# Altium integrated library AnalogDevices.IntLib: 130 symbols (part 3 of 4) (continued)
## ADM1266ACPZ (continued)
text: SENS; ADM; 1266

## ADM2682E
designator D?  (value not drawn)
RS-485 Isolated transceiver; Manufacturer: Analog Devices; ManufacturerPartNumber: ADM2682EBRIZ; Type: Микросхема; BCPId: *; Name: *; Package: RI-16-1
footprint SOIC127P1030X265-16N - 12.75lenght (SOIC, 16-Leads, Body 12,75x7,50mm, Pitch 1,27mm, IPC Medium Density)
pins: 1 GND1 (power) "Ground", 2 VCC (power) "External Capacitor Connection for the Regulated VCC Supply", 3 RxD (out) "External Capacitor Connection for the Regulated VCC Supply", 4 ~{RE} (in) "External Capacitor Connection for the Regulated VCC Supply", 5 DE (in) "External Capacitor Connection for the Regulated VCC Supply", 6 TxD (in) "External Capacitor Connection for the Regulated VCC Supply", 7 VCC (power) "External Capacitor Connection for the Regulated VCC Supply", 8 GND1 (power) "Ground", 9 GND2 (power) "Power ground", 10 Visoout (power) "Power ground", 11 Y (out) "Power ground", 12 Z (out) "Power ground", 13 B (in) "Power ground", 14 A (in) "Power ground", 15 Visoin (power) "Power ground", 16 GND2 (power) "Power ground"
text: A/B; 2682

## ADM4850
designator D?  (value not drawn)
5 V Selw-Rate Limited Half-Duplex RS-485/RS-422 Transceivers; ManufacturerPartNumber: ADM4850AR; Manufacturer: Analog Devices; Type: Микросхема; BCPId: *; TU/GOST: *; Package: SOIC-8
footprint SOIC127P600-8M (SOIC, 8-Leads, Body 4.9x3.9mm, Pitch 1.27mm, IPC Low Density)
pins: 1 RO (out) "Receiver Output", 2 ~{RE} (out) "Receiver Output Enable", 3 DE (out) "Driver Output Enable", 4 DI (in) "Driver Input", 5 GND (power), 6 A (io) "Noninverting Receiver Input A/Driver Output A", 7 B (io) "Inverting Receiver Input B/Driver Output B", 8 VCC (power) "5 V Power Supply"
text: A/B

## ADM7150ACPZ-3.3-R7
designator D?  (value not drawn)
800 mA, High PSRR, RF Linear Regulator 4.5 V to 16 V input voltage; Manufacturer: Analog Devices; Type: Микросхема; SymAuthor: Ерешко П.А.; Package: CP-8-11; ManufacturerPartNumber: ADM7150ACPZ-3.3-R7
footprint CP-8-11 (8-Lead Lead Frame Chip Scale Package [LFCSP_WD]   3 mmx3 mm Body, Very Very Thin, Dual Lead)
pins: 1 VREG "Regulated Input Supply Voltage to LDO Amplifier", 2 VOUT (power) "Regulated Output Voltage", 3 BYP "Low Noise Bypass Capacitor", 4 GND (power) "Ground", 5 RSNS "Reference Sense", 6 REF "Low Noise Reference Voltage Output", 7 EN (in) "Enable", 8 VIN (power) "Regulator Input Supply Voltage", EPAD EP (power) hidden to GND "Ground"
text: *STU; 7150

## ADM7150ACPZ-5.0-R7
designator D?  (value not drawn)
800 mA, High PSRR, RF Linear Regulator 4.5 V to 16 V input voltage; Manufacturer: Analog Devices; Type: Микросхема; SymAuthor: Ерешко П.А.; Package: CP-8-11; ManufacturerPartNumber: ADM7150ACPZ-5.0-R7
footprint CP-8-11 (8-Lead Lead Frame Chip Scale Package [LFCSP_WD]   3 mmx3 mm Body, Very Very Thin, Dual Lead)
pins: 1 VREG "Regulated Input Supply Voltage to LDO Amplifier", 2 VOUT (power) "Regulated Output Voltage", 3 BYP "Low Noise Bypass Capacitor", 4 GND (power) "Ground", 5 RSNS "Reference Sense", 6 REF "Low Noise Reference Voltage Output", 7 EN (in) "Enable", 8 VIN (power) "Regulator Input Supply Voltage", EPAD EP (power) hidden to GND "Ground"
text: *STU; 7150

## ADM7154ACPZ-1.8-R7
designator D?  (value not drawn)
600 mA, High PSRR, RF Linear Regulator; Manufacturer: Analog Devices; Type: Микросхема; SymAuthor: Ерешко П.А.; Package: CP-8-21; ManufacturerPartNumber: ADM7154ACPZ-1.8-R7
footprint QFN50P300X300X80_HS-9N (QFN, 8-Leads, Body 3,00x3,00mm, Pitch 0,50mm, Thermal Pad 2,54x1,70mm, IPC Medium Density)
pins: 1 VREG "Regulated Input Supply Voltage to LDO Amplifier", 2 VOUT (power) "Regulated Output Voltage", 3 BYP "Low Noise Bypass Capacitor", 4 GND (power) "Ground", 5 RSNS "Reference Sense", 6 REF "Low Noise Reference Voltage Output", 7 EN (in) "Enable", 8 VIN (power) "Regulator Input Supply Voltage", EPAD EP (power) hidden to GND "Ground"
text: *STU; 7154

## ADM7154ACPZ-3.3-R7
designator D?  (value not drawn)
600 mA, High PSRR, RF Linear Regulator; Manufacturer: Analog Devices; Type: Микросхема; SymAuthor: Ерешко П.А.; Package: CP-8-21; ManufacturerPartNumber: ADM7154ACPZ-3.3-R7
footprint QFN50P300X300X80_HS-9N (QFN, 8-Leads, Body 3,00x3,00mm, Pitch 0,50mm, Thermal Pad 2,54x1,70mm, IPC Medium Density)
pins: 1 VREG "Regulated Input Supply Voltage to LDO Amplifier", 2 VOUT (power) "Regulated Output Voltage", 3 BYP "Low Noise Bypass Capacitor", 4 GND (power) "Ground", 5 RSNS "Reference Sense", 6 REF "Low Noise Reference Voltage Output", 7 EN (in) "Enable", 8 VIN (power) "Regulator Input Supply Voltage", EPAD EP (power) hidden to GND "Ground"
text: *STU; 7154

## ADM7170ACPZ-3.3-R7
designator D?  (value not drawn)
6.5 V, 500 mA, Ultralow Noise, High PSRR, Fast Transient Response CMOS LDO; Manufacturer: Analog Devices; Type: Микросхема; Package: CP-8-21; ManufacturerPartNumber: ADM7170ACPZ-3.3-R7
footprint QFN50P300X300X80_HS-9N (QFN, 8-Leads, Body 3,00x3,00mm, Pitch 0,50mm, Thermal Pad 2,54x1,70mm, IPC Medium Density)
pins: 1 VOUT (power) "Regulated Output Voltage", 2 VOUT (power) "Regulated Output Voltage", 3 SENS "Sense Input. Connect this pin as close as possible to the load for best load regulation.", 4 SS "Soft Start", 5 EN (in) "Regulator Enable. Drive EN high to turn on the regulator", 6 GND (power) "Ground", 7 VIN (power) "Ground", 8 VIN (power) "Ground", EPAD EP (power) hidden to GND "Ground"
text: *STU; 7170

## ADM7170ACPZ-5.0-R7
designator D?  (value not drawn)
6.5 V, 500 mA, Ultralow Noise, High PSRR, Fast Transient Response CMOS LDO; Manufacturer: Analog Devices; Type: Микросхема; Package: CP-8-21; ManufacturerPartNumber: ADM7170ACPZ-5.0-R7
footprint QFN50P300X300X80_HS-9N (QFN, 8-Leads, Body 3,00x3,00mm, Pitch 0,50mm, Thermal Pad 2,54x1,70mm, IPC Medium Density)
pins: 1 VOUT (power) "Regulated Output Voltage", 2 VOUT (power) "Regulated Output Voltage", 3 SENS "Sense Input. Connect this pin as close as possible to the load for best load regulation.", 4 SS "Soft Start", 5 EN (in) "Regulator Enable. Drive EN high to turn on the regulator", 6 GND (power) "Ground", 7 VIN (power) "Ground", 8 VIN (power) "Ground", EPAD EP (power) hidden to GND "Ground"
text: *STU; 7170

## ADM7171ACPZ
designator D?, comment ADM7171ACPZ-X.X.-R7  (value not drawn)
6.5 V, 1 A, Ultralow Noise, High PSRR,  Fast Transient Response CMOS LDO; Manufacturer: Analog Devices; Type: Микросхема; BCPId: *; Name: *; Package: CP-8-21; ManufacturerPartNumber: ADM7171ACPZ-X.X.-R7
footprint QFN50P300X300X80_HS-9N (QFN, 8-Leads, Body 3,00x3,00mm, Pitch 0,50mm, Thermal Pad 2,54x1,70mm, IPC Medium Density)
pins: 1 VOUT (power) "Regulated Output Voltage", 2 VOUT (power) "Regulated Output Voltage", 3 SENS (power) "Sense Input", 4 SS "Soft Start", 5 EN (power) "Enable Input", 6 GND (power), 7 VIN (power) "Regulator Input Supply", 8 VIN (power) "Regulator Input Supply", EPAD (power) hidden to GND "The exposed GND pad"
text: *STU; ADM; 7171

## ADM8660ARZ
designator D?  (value not drawn)
CMOS Switched-Capacitor  Voltage Converters; Manufacturer: Analog Devices; Type: Микросхема; SymAuthor: Блохин В.А.; BCPId: *; Name: *; Package: R-8; ManufacturerPartNumber: ADM8660ARZ
footprint SOIC127P600-8M (SOIC, 8-Leads, Body 4.9x3.9mm, Pitch 1.27mm, IPC Low Density)
pins: 1 FC (power) "Frequency Control Input", 2 CAP+ (power) "Positive Charge-Pump Capacitor Termina", 3 GND (power), 4 CAP- (power) "Negative Charge-Pump Capacitor Terminal", 5 OUT (power) "Output, Negative Voltage", 6 LV (power) "Low Voltage Operation Input", 7 SD (power) "Shutdown", 8 V+ (power) "Positive Power Supply Input"
text: *STU; ADM; 8660

## ADP150AUJZ
designator D?  (value not drawn)
150 mA CMOS Linear Regulator; Manufacturer: Analog Devices; Type: Микросхема; SymAuthor: Календарова В.; BCPId: *; Package: UJ-5; Tolerance: *; ManufacturerPartNumber: ADP150AUJZ
footprint SOT95P280X100-5N (SOT23, 5-Leads, Body 2,90x2,80mm, Pitch 0,95mm, IPC Medium Density)
pins: 1 Vin (in), 2 GND (power), 3 EN (in), 4 NC hidden, 5 Vout (power)
text: STU

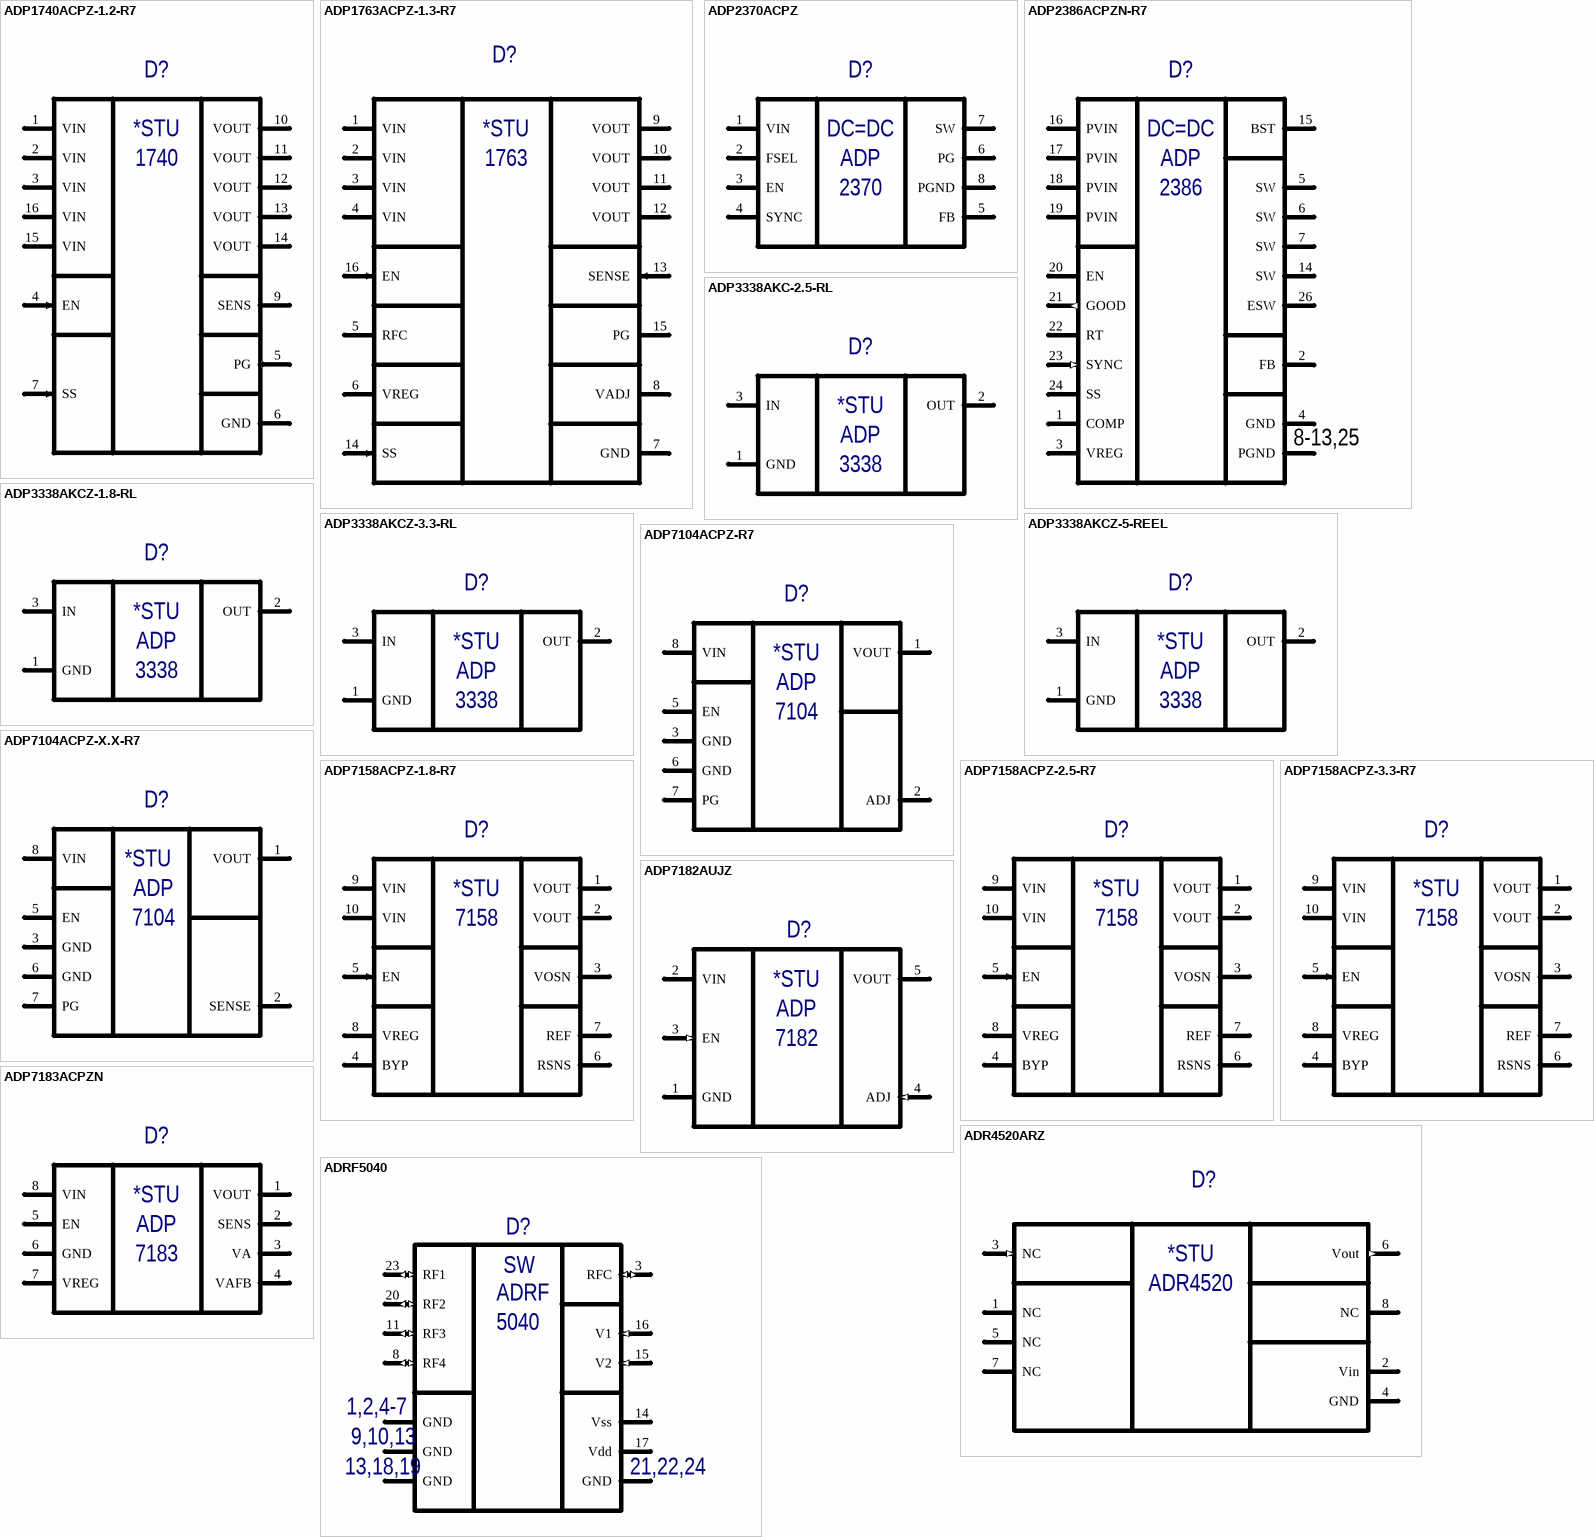
[diagram p14: symbols ADP1740ACPZ-1.2-R7 to ADRF5040]

## ADP1740ACPZ-1.2-R7
designator D?  (value not drawn)
6.5 V, 500 mA, Ultralow Noise, High PSRR, RF Linear Regulator; Manufacturer: Analog Devices; Type: Микросхема; Package: CP-16-23; ManufacturerPartNumber: ADP1740ACPZ-1.2-R7
footprint QFN65P400X400X80_HS-17N (QFN, 16-Leads, Body 4,00x4,00mm, Pitch 0,65mm, Thermal Pad 2,10x2,10mm, IPC Medium Density)
pins: 1 VIN (power) "Regulator Input Supply Voltage", 2 VIN (power) "Regulator Input Supply Voltage", 3 VIN (power) "Regulator Input Supply Voltage", 4 EN (in) "Enable", 5 PG (out) "Power-Good", 6 GND (power) "Ground", 7 SS (in) "Soft Start", 8 NC hidden "Not Connected.", 9 SENS "Sense Input", 10 VOUT (power) "Regulated Output Voltage", 11 VOUT (power) "Regulated Output Voltage", 12 VOUT (power) "Regulated Output Voltage", 13 VOUT (power) "Regulated Output Voltage", 14 VOUT (power) "Regulated Output Voltage", 15 VIN (power) "Regulator Input Supply Voltage", 16 VIN (power) "Regulator Input Supply Voltage", EPAD EP (power) hidden to GND "Ground"
text: *STU; 1740

## ADP1763ACPZ-1.3-R7
designator D?  (value not drawn)
3 A, Low VIN, Low Noise, CMOS Linear Regulator; Manufacturer: Analog Devices; Type: Микросхема; SymAuthor: Ерешко П.А.; Package: CP-16-22; ManufacturerPartNumber: ADP1763ACPZ-1.3-R7
footprint QFN50P300X300X80_HS175X175-17N (QFN, 16-Leads, Body 3,00x3,00mm, Pitch 0,50mm, Thermal Pad 1,75x1,75mm, IPC Medium Density)
pins: 1 VIN (power) "Power Input", 2 VIN (power) "Power Input", 3 VIN (power) "Power Input", 4 VIN (power) "Power Input", 5 RFC "Reference Filter Capacitor. Connect a 1 µF capacitor from the REFCAP pin to ground", 6 VREG "Regulated Input Supply to LDO Amplifier. Bypass VREG to GND with a 1 µF or greater capacitor.", 7 GND (power) "Power Ground", 8 VADJ "Adjustable Voltage Pin for the Adjustable Output Option", 9 VOUT (power) "Power Output", 10 VOUT (power) "Power Output", 11 VOUT (power) "Power Output", 12 VOUT (power) "Power Output", 13 SENSE (in) "Sense Input", 14 SS (in) "Soft Start Pin", 15 PG (oc) "Power Good Output", 16 EN (in) "Enable Input", EPAD (power) hidden to GND "Exposed Pad. The exposed pad is electrically connected to GND."
text: *STU; 1763

## ADP2370ACPZ
designator D?, comment ADP2370ACPZ-X.X-R7  (value not drawn)
High Voltage, 1.2 MHz/600 kHz, 800 mA, Low Quiescent Current Buck Regulator; Manufacturer: Analog Devices; Type: Микросхема; BCPId: *; Name: *; Package: CP-8-5; ManufacturerPartNumber: ADP2370ACPZ-X.X-R7
footprint QFN50P300X300X80_HS-9N (QFN, 8-Leads, Body 3,00x3,00mm, Pitch 0,50mm, Thermal Pad 2,54x1,70mm, IPC Medium Density)
pins: 1 VIN (power) "Power Input", 2 FSEL (power) "Frequency Select", 3 EN (power) "Enable", 4 SYNC (power) "Synchronize", 5 FB (power) "Feedback", 6 PG (power) "Power Good", 7 SW (power) "Switch Node Output", 8 PGND (power) "Power Ground", EPAD (power) hidden to GND "Exposed Pad"
text: DC=DC; ADP; 2370

## ADP2386ACPZN-R7
designator D?  (value not drawn)
20 V, 6 A, Synchronous Step-Down   DC-to-DC Regulator; Manufacturer: Analog Devices; Type: Микросхема; SymAuthor: Блохин В.А.; BCPId: *; Name: *; Package: CP-24-12; ManufacturerPartNumber: ADP2386ACPZN-R7
footprint QFN50P400X400X80_HS-26N (QFN, 24-Leads, Body 4,00x4,00mm, Pitch 0,50mm, Thermal Pad 2,8x1,5mm, Thermal Pad 2,8x1,05mm, IPC Medium Density)
pins: 1 COMP (power) "Error Amplifier Output", 2 FB (power) "Feedback Voltage Sense Input", 3 VREG (power) "Output of the Internal 8 V Regulator", 4 GND (power) "Analog Ground", 5 SW (power) "Switch Node Output", 6 SW (power) "Switch Node Output", 7 SW (power) "Switch Node Output", 8 PGND (power) "Power Ground", 9 PGND (power) hidden to GND "Power Ground", 10 PGND (power) hidden to GND "Power Ground", 11 PGND (power) hidden to GND "Power Ground", 12 PGND (power) hidden to GND "Power Ground", 13 PGND (power) hidden to GND "Power Ground", 14 SW (power) "Switch Node Output", 15 BST (power) "Supply Rail for the High-Side Gate Drive", 16 PVIN (power) "Power Input", 17 PVIN (power) "Power Input", 18 PVIN (power) "Power Input", 19 PVIN (power) "Power Input", 20 EN (power) "Precision Enable Pin", 21 GOOD (out) "Power-Good Output", 22 RT (power) "Frequency Setting", 23 SYNC (in) "Synchronization Input", 24 SS "Soft Start Control", 25 EGND (power) hidden to GND "The exposed GND pad", 26 ESW (power) "The exposed SW pad"
text: DC=DC; ADP; 2386; 8-13,25

## ADP3338AKC-2.5-RL
designator D?  (value not drawn)
High Accuracy, Ultralow IQ, 1 A, anyCAP ® Low Dropout Regulator; Manufacturer: Analog Devices; Type: Микросхема; SymAuthor: Семенов В.С.; BCPId: *; Name: *; Package: 3-Lead SOT-223; ManufacturerPartNumber: ADP3338AKC-2.5-RL
footprint SOT230P700X180-4N (SOT223, 4-Leads, Body 6,7x7,3mm (max), Pitch 2,30mm, IPC Medium Density)
pins: 1 GND (power) "Ground", 2 OUT (power) "Output", 3 IN (power) "Input"
text: *STU; ADP; 3338

## ADP3338AKCZ-1.8-RL
designator D?  (value not drawn)
High Accuracy, Ultralow IQ, 1 A, anyCAP ® Low Dropout Regulator; Manufacturer: Analog Devices; Type: Микросхема; BCPId: *; Name: *; Package: SOT-223; ManufacturerPartNumber: ADP3338AKCZ-1.8-RL
footprint SOT230P700X180-4N (SOT223, 4-Leads, Body 6,7x7,3mm (max), Pitch 2,30mm, IPC Medium Density)
pins: 1 GND (power) "Ground", 2 OUT (power) "Output", 3 IN (power) "Input"
text: *STU; ADP; 3338

## ADP3338AKCZ-3.3-RL
designator D?  (value not drawn)
High Accuracy, Ultralow IQ, 1 A, anyCAP ® Low Dropout Regulator; Manufacturer: Analog Devices; Type: Микросхема; BCPId: *; Name: *; Package: SOT-223; ManufacturerPartNumber: ADP3338AKCZ-3.3-RL
footprint SOT230P700X180-4N (SOT223, 4-Leads, Body 6,7x7,3mm (max), Pitch 2,30mm, IPC Medium Density)
pins: 1 GND (power) "Ground", 2 OUT (power) "Output", 3 IN (power) "Input"
text: *STU; ADP; 3338

## ADP3338AKCZ-5-REEL
designator D?  (value not drawn)
High Accuracy, Ultralow IQ, 1 A, anyCAP ® Low Dropout Regulator; Manufacturer: Analog Devices; Type: Микросхема; BCPId: *; Name: *; Package: SOT-223; ManufacturerPartNumber: ADP3338AKCZ-5-REEL
footprint SOT230P700X180-4N (SOT223, 4-Leads, Body 6,7x7,3mm (max), Pitch 2,30mm, IPC Medium Density)
pins: 1 GND (power) "Ground", 2 OUT (power) "Output", 3 IN (power) "Input"
text: *STU; ADP; 3338

## ADP7104ACPZ-R7
designator D?  (value not drawn)
20 V, 500 mA, Low Noise, CMOS LDO; Manufacturer: Analog Devices; Type: Микросхема; SymAuthor: Блохин В.А.; BCPId: *; Name: *; Package: CP-8-5; ManufacturerPartNumber: ADP7104ACPZ-R7
footprint QFN50P300X300X80_HS-9N (QFN, 8-Leads, Body 3,00x3,00mm, Pitch 0,50mm, Thermal Pad 2,54x1,70mm, IPC Medium Density)
pins: 1 VOUT (power) "Regulated Output Voltage", 2 ADJ (power) "Adjust Input", 3 GND (power), 4 NC hidden "Do Not Connect to this Pin", 5 EN (power) "Enable Input", 6 GND (power), 7 PG  (power) "Power Good", 8 VIN (power) "Regulator Input Supply", EPAD (power) hidden to GND "The exposed GND pad"
text: *STU; ADP; 7104

## ADP7104ACPZ-X.X-R7
designator D?  (value not drawn)
20 V, 500 mA, Low Noise, CMOS LDO; Manufacturer: Analog Devices; Type: Микросхема; SymAuthor: Блохин В.А.; BCPId: *; Name: *; Package: CP-8-5; ManufacturerPartNumber: ADP7104ACPZ-X.X-R7
footprint QFN50P300X300X80_HS-9N (QFN, 8-Leads, Body 3,00x3,00mm, Pitch 0,50mm, Thermal Pad 2,54x1,70mm, IPC Medium Density)
pins: 1 VOUT (power) "Regulated Output Voltage", 2 SENSE (power) "Adjust Input", 3 GND (power), 4 NC hidden "Do Not Connect to this Pin", 5 EN (power) "Enable Input", 6 GND (power), 7 PG  (power) "Power Good", 8 VIN (power) "Regulator Input Supply", EPAD (power) hidden to GND "The exposed GND pad"
text: *STU; ADP; 7104

## ADP7158ACPZ-1.8-R7
designator D?  (value not drawn)
2 A, Ultralow Noise, High PSRR, RF Linear Regulator; Manufacturer: Analog Devices; Type: Микросхема; SymAuthor: Иванова И.С.; Package: CP-10-9; ManufacturerPartNumber: ADP7158ACPZ-1.8-R7
footprint CP-10-9 (8-10-Lead Lead Frame Chip Scale Package [LFCSP]   3 mmx3 mm Body and 0.75 mm Package Height)
pins: 1 VOUT (power) "Regulated Output Voltage", 2 VOUT (power) "Regulated Output Voltage", 3 VOSN "Output Sense", 4 BYP "Low Noise Bypass Capacitor", 5 EN (in) "Enable", 6 RSNS "Reference Sense", 7 REF "Low Noise Reference Voltage Output", 8 VREG "Regulated Input Supply Voltage to LDO Amplifier", 9 VIN (power) "Regulator Input Supply Voltage", 10 VIN (power) "Regulator Input Supply Voltage", EPAD EP (power) hidden to GND "Ground"
text: *STU; 7158

## ADP7158ACPZ-2.5-R7
designator D?  (value not drawn)
2 A, Ultralow Noise, High PSRR, RF Linear Regulator; Manufacturer: Analog Devices; Type: Микросхема; SymAuthor: Ерешко П.А.; Package: CP-10-9; ManufacturerPartNumber: ADP7158ACPZ-2.5-R7
footprint CP-10-9 (8-10-Lead Lead Frame Chip Scale Package [LFCSP]   3 mmx3 mm Body and 0.75 mm Package Height)
pins: 1 VOUT (power) "Regulated Output Voltage", 2 VOUT (power) "Regulated Output Voltage", 3 VOSN "Output Sense", 4 BYP "Low Noise Bypass Capacitor", 5 EN (in) "Enable", 6 RSNS "Reference Sense", 7 REF "Low Noise Reference Voltage Output", 8 VREG "Regulated Input Supply Voltage to LDO Amplifier", 9 VIN (power) "Regulator Input Supply Voltage", 10 VIN (power) "Regulator Input Supply Voltage", EPAD EP (power) hidden to GND "Ground"
text: *STU; 7158

## ADP7158ACPZ-3.3-R7
designator D?  (value not drawn)
2 A, Ultralow Noise, High PSRR, RF Linear Regulator; Manufacturer: Analog Devices; Type: Микросхема; SymAuthor: Иванова И.С.; Package: CP-10-9; ManufacturerPartNumber: ADP7158ACPZ-3.3-R7
footprint CP-10-9 (8-10-Lead Lead Frame Chip Scale Package [LFCSP]   3 mmx3 mm Body and 0.75 mm Package Height)
pins: 1 VOUT (power) "Regulated Output Voltage", 2 VOUT (power) "Regulated Output Voltage", 3 VOSN "Output Sense", 4 BYP "Low Noise Bypass Capacitor", 5 EN (in) "Enable", 6 RSNS "Reference Sense", 7 REF "Low Noise Reference Voltage Output", 8 VREG "Regulated Input Supply Voltage to LDO Amplifier", 9 VIN (power) "Regulator Input Supply Voltage", 10 VIN (power) "Regulator Input Supply Voltage", EPAD EP (power) hidden to GND "Ground"
text: *STU; 7158

## ADP7182AUJZ
designator D?, comment ADP7182AUJZ-X.X-R7  (value not drawn)
–28 V, −200 mA, Low Noise,  Linear Regulator; Manufacturer: Analog Devices; Type: Микросхема; BCPId: *; Name: *; Package: TSOT; ManufacturerPartNumber: ADP7182AUJZ-X.X-R7
footprint SOT95P280X100-5N (SOT23, 5-Leads, Body 2,90x2,80mm, Pitch 0,95mm, IPC Medium Density)
pins: 1 GND (power), 2 VIN (power) "Regulator Input Supply", 3 EN (in) "Enable", 4 ADJ (in) "Adjustable Input", 5 VOUT (power) "Regulated Output Voltage"
text: *STU; ADP; 7182

## ADP7183ACPZN
designator D?, comment ADP7183ACPZN*.*-R7  (value not drawn)
−300 mA, Ultralow Noise, High PSRR,  Low Dropout Linear Regulator; Manufacturer: Analog Devices; Type: Микросхема; SymAuthor: Блохин В.А.; BCPId: *; Name: *; Package: CP-8-27; ManufacturerPartNumber: ADP7183ACPZN*.*-R7
footprint QFN50P200X200X60_HS-9N (Footprint not found)
pins: 1 VOUT (power) "Regulated Output Voltage", 2 SENS (power) "Sense Input", 3 VA (power) "Low Noise Reference Voltage", 4 VAFB (power) "Output Voltage Reference Feedback", 5 EN (power) "Enable", 6 GND (power), 7 VREG (power) "Regulated Input Supply", 8 VIN (power) "Regulator Input Supply", EPAD (power) hidden to GND "The exposed GND pad"
text: *STU; ADP; 7183

## ADR4520ARZ
designator D?  (value not drawn)
Ultralow Noise, High Accuracy / Voltage References; Manufacturer: Analog Devices; Type: Микросхема; ManufacturerPartNumber: ADR4520ARZ; Package: R-8
footprint SOIC127P600-8M (SOIC, 8-Leads, Body 4.9x3.9mm, Pitch 1.27mm, IPC Low Density)
pins: 1 NC, 2 Vin (power), 3 NC (in), 4 GND (power), 5 NC, 6 Vout (out), 7 NC, 8 NC
text: *STU; ADR4520

## ADRF5040
designator D?, comment ADRF5040BCPZ  (value not drawn)
igh Isolation, Silicon SP4T,  Nonreflective Switch, 9 kHz to 12.0 GHz; Manufacturer: Analog Devices, Inc.; Type: Микросхема; BCPId: *; Name: *; Package: CP-24-16; ManufacturerPartNumber: ADRF5040BCPZ
footprint QFN50P400X400X90_HS270x270-25N (QFN, 24-Leads, Body 4,00x4,00mm, Pitch 0,50mm, Thermal Pad 2,7x2,7mm, IPC Medium Density)
pins: 1 GND (power), 2 GND (power), 3 RFC (io) "RF Common Port", 4 GND (power), 5 GND (power), 6 GND (power) hidden to GND, 7 GND (power) hidden to GND, 8 RF4 (io) "RF4 Port", 9 GND (power) hidden to GND, 10 GND (power) hidden to GND, 11 RF3 (io) "RF3 Port", 12 GND (power) hidden to GND, 13 GND (power) hidden to GND, 14 Vss (power) "Negative Supply Voltage Pin", 15 V2 (in) "Control Input Pin 2", 16 V1 (in) "Control Input Pin 1", 17 Vdd (power) "Positive Supply Voltage", 18 GND (power) hidden to GND, 19 GND (power) hidden to GND, 20 RF2 (io) "RF2 Port", 21 GND (power) hidden to GND, 22 GND (power) hidden to GND, 23 RF1 (io) "RF1 Port", 24 GND (power) hidden to GND, EPAD GND (power) hidden to GND "Ground Paddle"
text: SW; ADRF; 5040; 1,2,4-7; 9,10,13; 13,18,19; 21,22,24

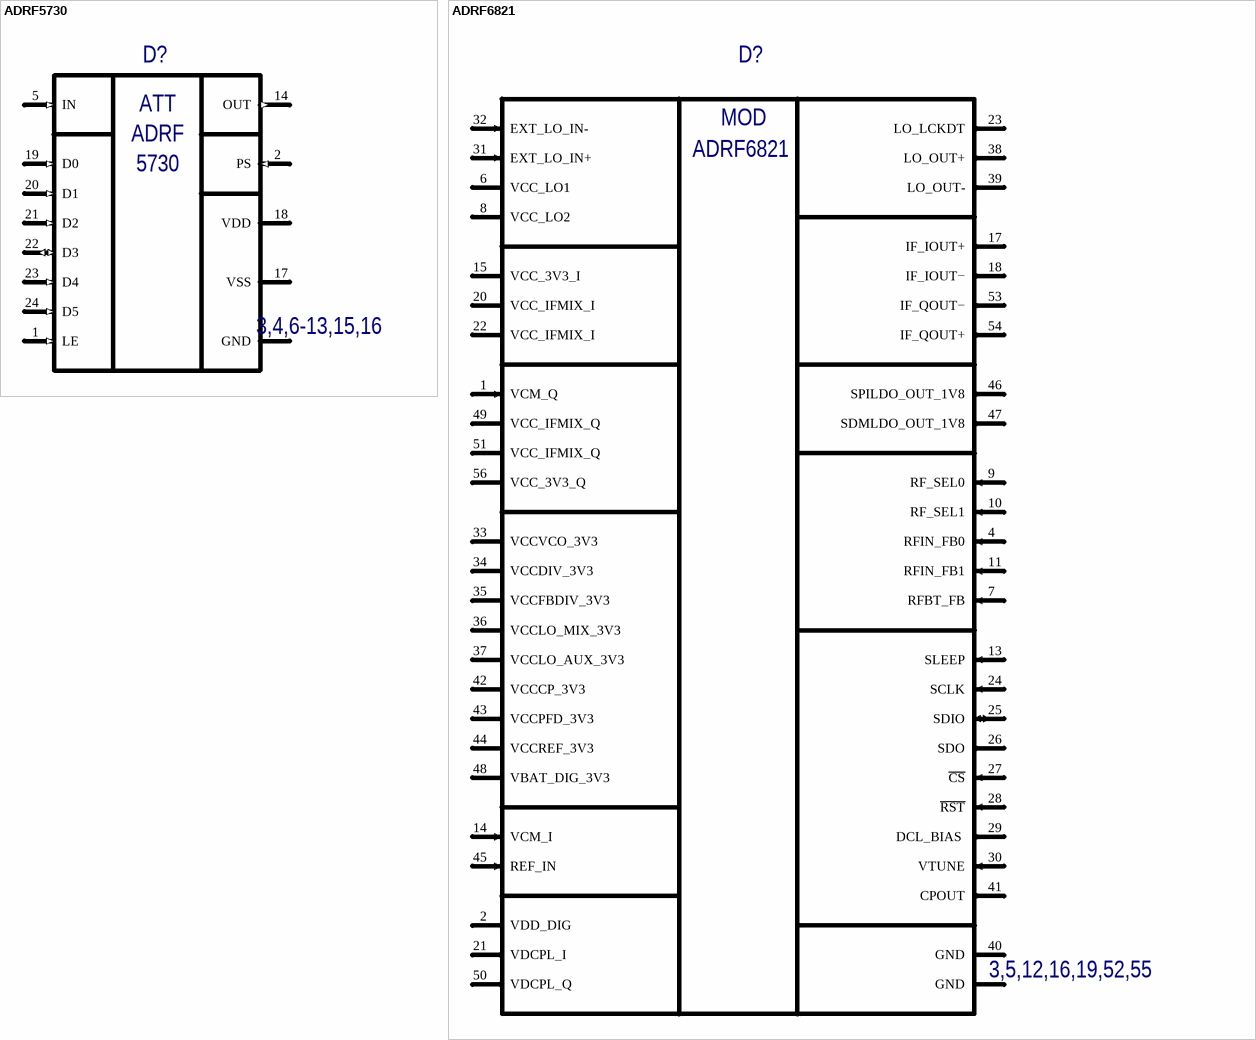
[diagram p15: symbols ADRF5730 to ADRF6821]

## ADRF5730
designator D?, comment ADRF5730BCCZN  (value not drawn)
0.5 dB LSB, 6-Bit, Silicon Digital  Attenuator, 100 MHz to 40 GHz; Manufacturer: Analog Devices; Type: Микросхема; SymAuthor: Блохин В.А.; BCPId: *; ManufacturerPartNumber: ADRF5730BCCZN; Name: *; Package: CC-24-5
footprint LGA50P400X400X075-25N (Body:4.00х4.00х0.75mm; Pitch 0.5mm; 24-Leads; Thermal Pad 2.5x2.5)
pins: 1 LE (in) "Latch Enable Input", 2 PS (in) "Parallel or Serial Control Interface Selection Input", 3 GND (power), 4 GND (power) hidden to GND, 5 IN (in) "Attenuator Input", 6 GND (power) hidden to GND, 7 GND (power) hidden to GND, 8 GND (power) hidden to GND, 9 GND (power) hidden to GND, 10 GND (power) hidden to GND, 11 GND (power) hidden to GND, 12 GND (power) hidden to GND, 13 GND (power) hidden to GND, 14 OUT (out) "Attenuator Output", 15 GND (power) hidden to GND, 16 GND (power) hidden to GND, 17 VSS (power) "Negative Supply Input", 18 VDD (power) "Positive Supply Input", 19 D0 (in) "0.5 dB Attenuator Bit", 20 D1 (in) "1 dB Attenuator Bit", 21 D2 (in) "2 dB Attenuator Bit", 22 D3 (io) "4 dB Attenuator Bit/Serial Data Output", 23 D4 (in) "8 dB Attenuator Bit/Serial Data Input", 24 D5 (in) "16 dB Attenuator Bit/Serial Clock Input", EPAD (power) hidden to GND "Exposed ground paddle must be connected to RF/DC ground"
text: ATT; ADRF; 5730; 3,4,6-13,15,16

## ADRF6821
designator D?  (value not drawn)
450 MHz to 2800 MHz, DPD RFIC with  Integrated Fractional-N PLL and VCO; Manufacturer: Analog Devices; ManufacturerPartNumber: ADRF6821ACPZ; Type: Микросхема; Package: CP-56-16
footprint QFN50P800X800X80_HS670x670-57N (QFN, 56-Leads, Body 8,00x8,00mm, Pitch 0,50mm, Thermal Pad 6,7x6,7mm, IPC Medium Density)
pins: 1 VCM_Q (in) "Q Channel VCM Input.", 2 VDD_DIG (power) "Digital VDD (1.8 V) Pin from On-Chip LDO.", 3 GND (power), 4 RFIN_FB0 (in) "RF Input 0 Single-Pole, Double-Throw (SPDT), 50 Ω Single-Ended.", 5 GND (power) hidden to GND, 6 VCC_LO1 (power) "LO Path VCC.", 7 RFBT_FB (in) "RF Input Low Frequency Balun Connection.", 8 VCC_LO2 (power) "LO Path VCC.", 9 RF_SEL0 (in) "RF Input 0 Select.", 10 RF_SEL1 (in) "RF Input 1 Select.", 11 RFIN_FB1 (in) "RF Input 1 SPDT, 50 Ω Single-Ended.", 12 GND (power) hidden to GND, 13 SLEEP (in) "Pin Controllable Fast Turn On/Off", 14 VCM_I (in) "I Channel VCM Input.", 15 VCC_3V3_I (power) "I Channel 3.3 V Supply.", 16 GND (power) hidden to GND, 17 IF_IOUT+ (out) "I Channel IF Positive Output.", 18 IF_IOUT− (out) "I Channel IF Negative Output.", 19 GND (power) hidden to GND, 20 VCC_IFMIX_I (power) "I Channel IF Amplifier VCC Supply.", 21 VDCPL_I (out) "I Channel Mixer Decoupling.", 22 VCC_IFMIX_I (power) "I Channel Mixer VCC Supply.", 23 LO_LCKDT (out) "LO Lock Detect.", 24 SCLK (in) "SPI Clock.", 25 SDIO (io) "SPI Data Input/Output in 3-Wire Mode. SPI data input in 4-wire mode", 26 SDO (out) "SPI Data Output. SDO used in 4-wire mode only.", 27 ~{CS} (in) "SPI Chip Select (N).", 28 ~{RST} (in) "Reset (Active Low).", 29 DCL_BIAS  (out) "VCO Core Bias Decouple.", 30 VTUNE (in) "V TUNE Input.", 31 EXT_LO_IN+ (in) "Positive External LO Input.", 32 EXT_LO_IN- (in) "Negative External LO Input.", 33 VCCVCO_3V3 (power) "VCC 3.3 V Supply.", 34 VCCDIV_3V3 (power) "LO Chain and Divider 3.3 V Supply.", 35 VCCFBDIV_3V3 (power) "PLL Feedback Divider 3.3 V Supply.", 36 VCCLO_MIX_3V3 (power) "LO Mixer Output Buffer 3.3 V Supply.", 37 VCCLO_AUX_3V3 (power) "LO External Output Buffer 3.3 V Supply.", 38 LO_OUT+ (out) "Positive External LO Output.", 39 LO_OUT- (out) "Negative External LO Output.", 40 GND (power) "Charge Pump Ground.", 41 CPOUT (out) "Charge Pump Output.", 42 VCCCP_3V3 (power) "Charge Pump 3.3 V Supply.", 43 VCCPFD_3V3 (power) "PFD 3.3 V Supply.", 44 VCCREF_3V3 (power) "Reference Input Buffer 3.3 V Supply.", 45 REF_IN (in) "Reference Input Buffer.", 46 SPILDO_OUT_1V8 (out) "SPI 1.8 V LDO External Decouple Output.", 47 SDMLDO_OUT_1V8 (out) "Sigma-Delta Modulator (SDM) 1.8 V LDO External Decouple Output.", 48 VBAT_DIG_3V3 (power) "SPI and SDM LDO 3.3 V Input.", 49 VCC_IFMIX_Q (power) "Q Channel Mixer VCC Supply.", 50 VDCPL_Q (out) "Q Channel Mixer Decoupling.", 51 VCC_IFMIX_Q  (power) "Q Channel IF Amplifier VCC Supply.", 53 IF_QOUT− (out) "Q Channel IF Negative Output.", 54 IF_QOUT+ (out) "Q Channel IF Positive Output.", 55 GND hidden, 56 VCC_3V3_Q (power) "Q Channel 3.3 V Supply.", EPAD hidden
text: MOD; 3,5,12,16,19,52,55

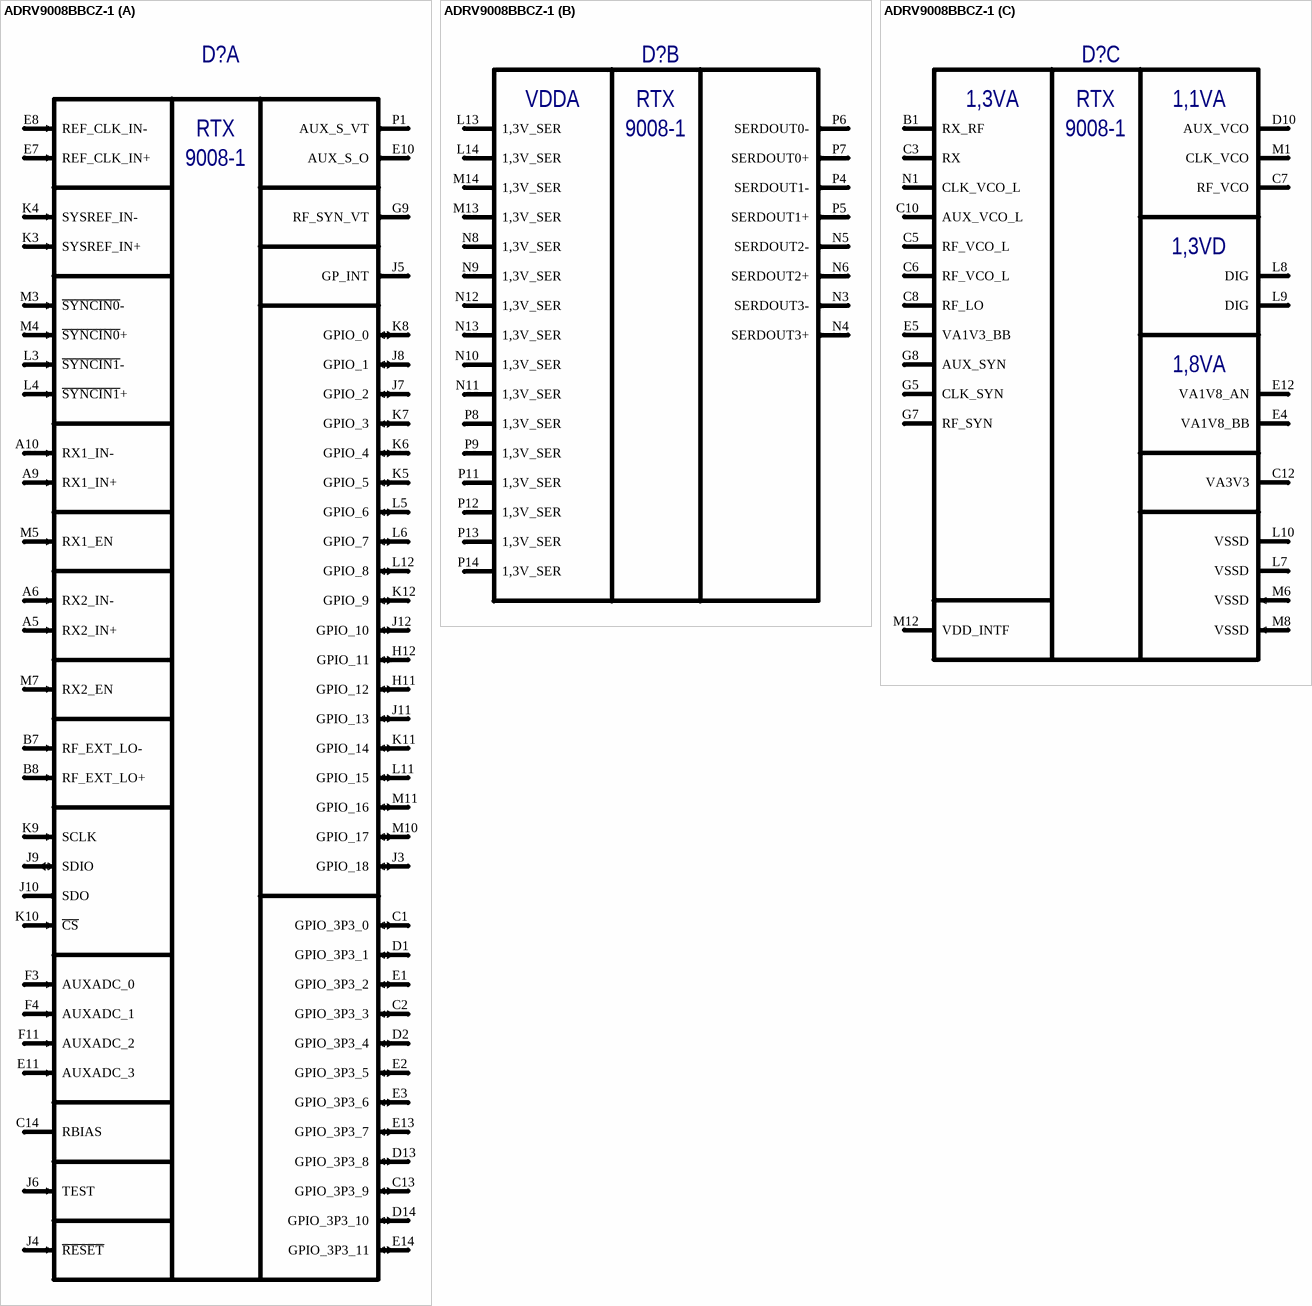
[diagram p16: symbol ADRV9008BBCZ-1]

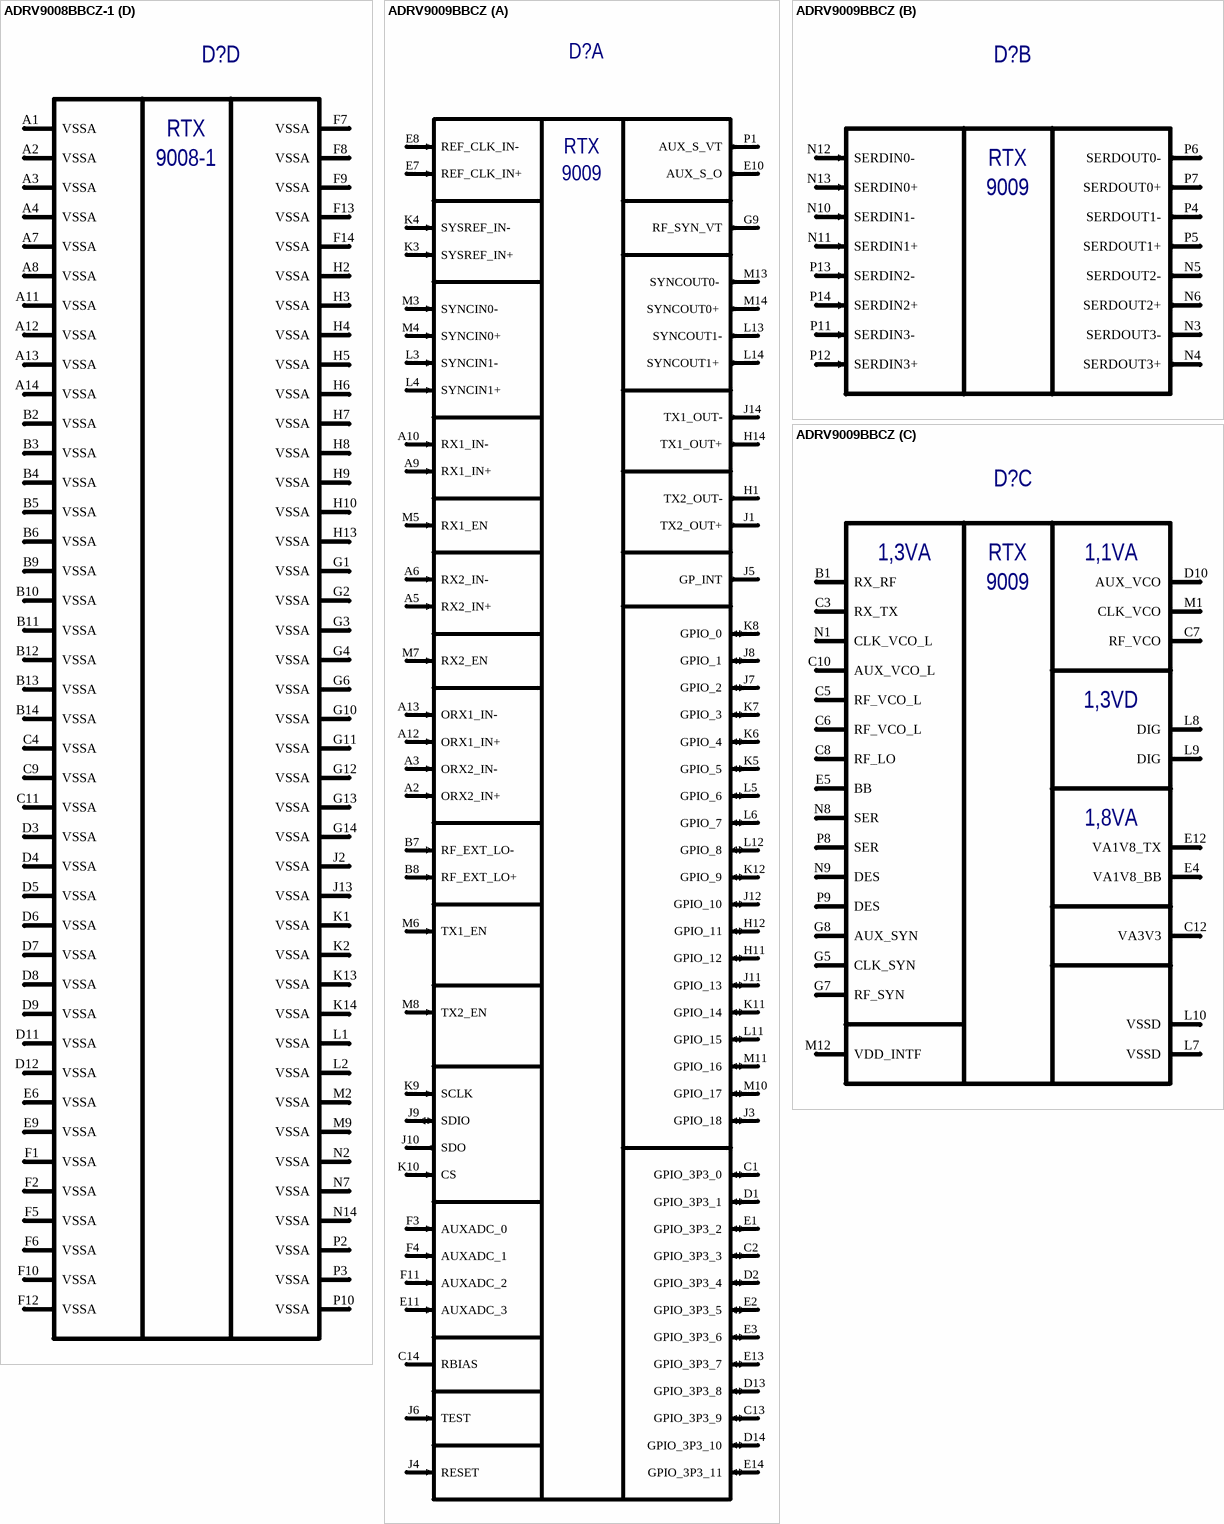
[diagram p17: symbols ADRV9008BBCZ-1 to ADRV9009BBCZ]